# Altium footprint library terminal_blocks.PcbLib: 74 footprints (part 3 of 5)
Each footprint in its own frame and in the unit in brackets; x right, y up, seen from the top. Pads: shape width x height; smd on the part's side, far side on the other; paste and mask are expansions set on the pad; w line width, h text height; cw(c..) or ccw(c..) is an arc to the next point about the centre after c.
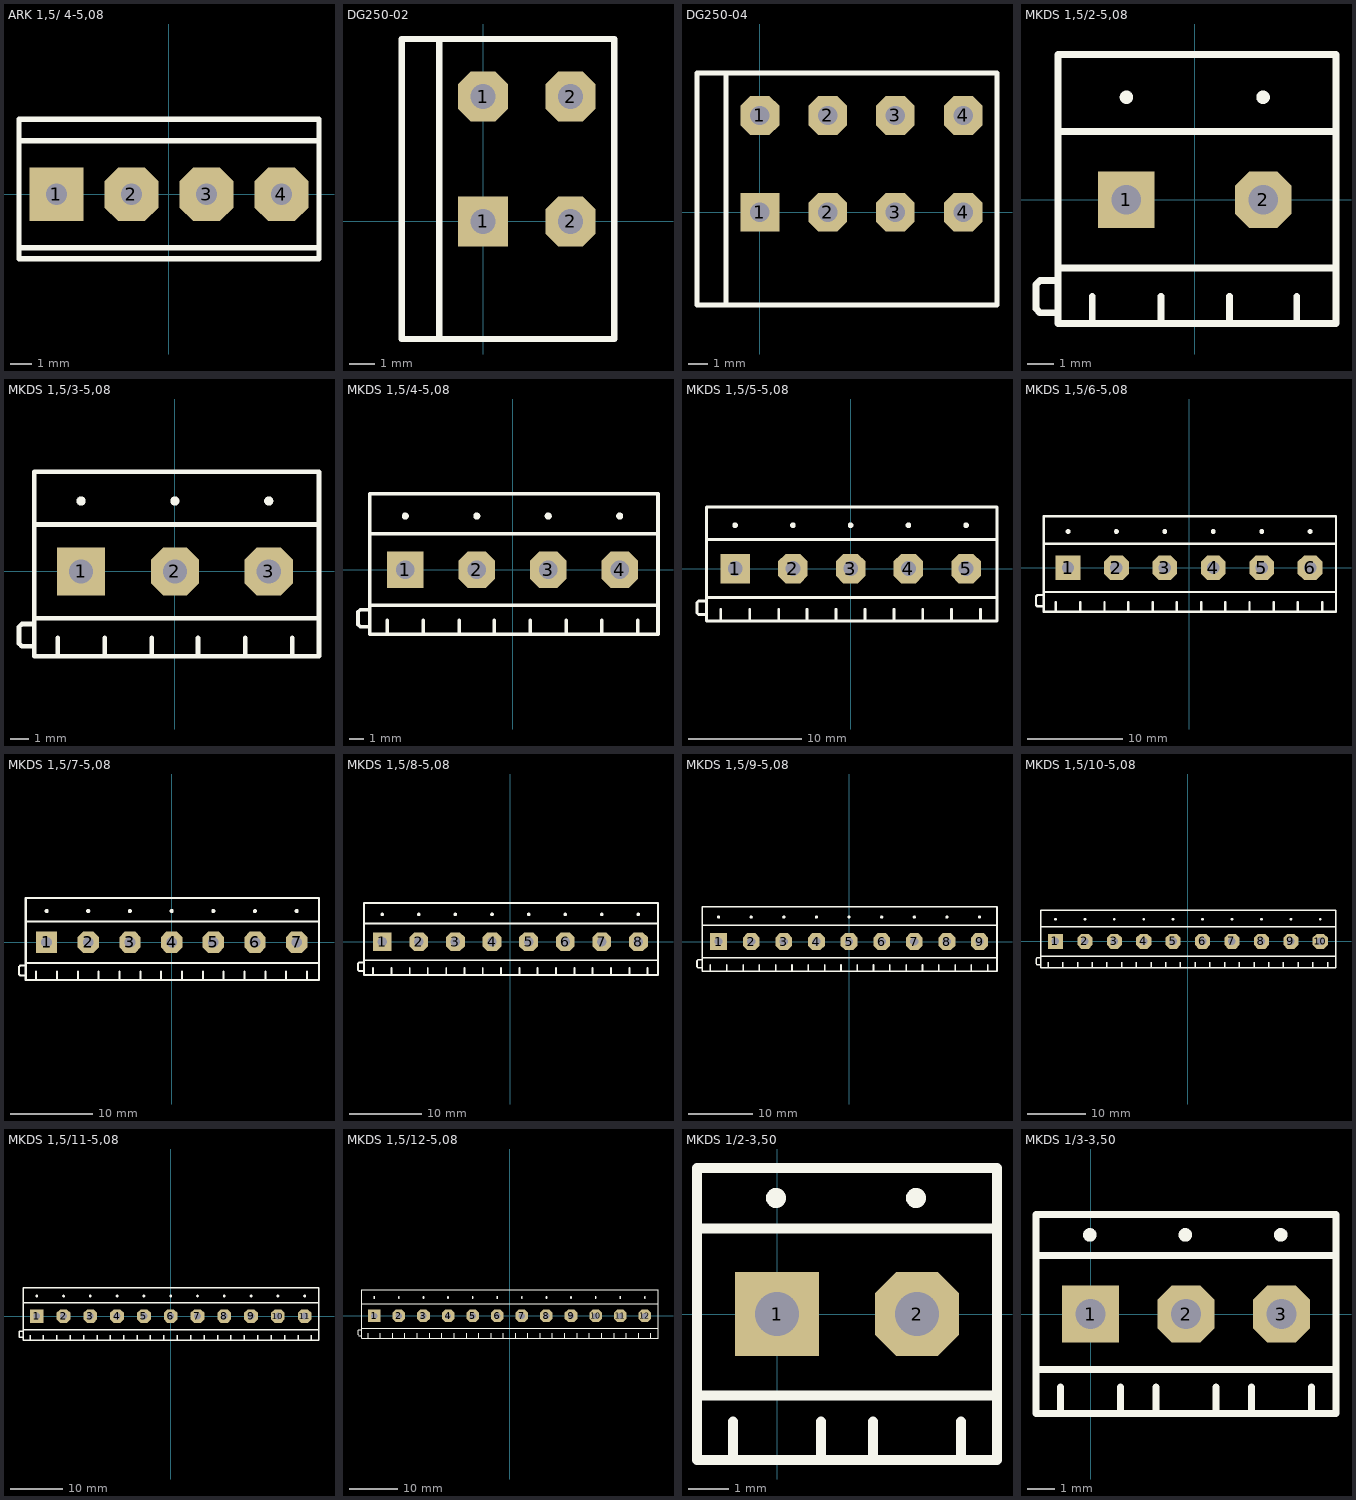
[diagram p2: the footprints below, top view; thin cyan lines are the x and y axes]

## ARK 1,5/ 4-5,08 [mm]
pads (4):
  rect 2.5x2.5 hole 1: 1(-5.25,0)
  oct 2.5x2.5 hole 1: 2(-1.75,0) 3(1.75,0) 4(5.25,0)
Top Overlay:
  lines w0.254: -7,-2.5 7,-2.5 ; -7,2.5 7,2.5 ; -7,-3 7,-3 7,3.5 -7,3.5 -7,-3

## DG250-02 [mm]
pads (4):
  rect 2x2 hole 1: 1(0,0)
  oct 2x2 hole 1: 1(0,5) 2(3.5,0) 2(3.5,5)
Top Overlay:
  lines w0.254: -1.75,-4.7 -3.25,-4.7 -3.25,7.3 -1.75,7.3 ; -1.75,-4.7 -1.75,7.3 ; -1.75,-4.7 5.25,-4.7 5.25,7.3 -1.75,7.3
3D body "User Library-wago250-101.STEP": height 12.67, standoff 0, extent -3.25,-4.7 1.75,7.3
3D body "User Library-wago250-101_no_tap.step": height 12.68, standoff 0, extent 1.75,-4.7 5.25,7.3

## DG250-04 [mm]
pads (8):
  rect 2x2 hole 1: 1(0,0)
  oct 2x2 hole 1: 1(0,5) 2(3.5,0) 2(3.5,5) 3(7,0) 3(7,5) 4(10.5,0) 4(10.5,5)
Top Overlay:
  lines w0.254: -1.75,-4.8 12.25,-4.8 12.25,7.2 -1.75,7.2 ; -1.75,-4.8 -1.75,7.2 ; -1.75,-4.8 -3.25,-4.8 -3.25,7.2 -1.75,7.2
3D body "User Library-wago250-101_no_tap.step": height 12.68, standoff 0, extent 8.75,-4.8 12.25,7.2
3D body "User Library-wago250-101.step": height 12.67, standoff 0, extent -3.25,-4.8 1.75,7.2
3D body "User Library-wago250-101_no_tap.step": height 12.68, standoff 0, extent 1.75,-4.8 5.25,7.2
3D body "User Library-wago250-101_no_tap.step": height 12.68, standoff 0, extent 5.25,-4.8 8.75,7.2

## MKDS 1,5/2-5,08 [mm] "Phoenix Contact MKDS 1,5,  5,08mm PITCH PCB Terminal Block"
height 13.8
pads (2):
  rect 2.1x2.1 hole 1.1: 1(-2.54,0)
  oct 2.1x2.1 hole 1.1: 2(2.54,0)
Top Overlay:
  circle w0.25: c2.54,3.81 r0.125
  circle w0.25: c-2.54,3.81 r0.125
  lines w0.254: -5.1,-3 -5.75,-3 -5.9,-3.15 -5.9,-4.05 -5.75,-4.2 -5.08,-4.2 ; -5.08,-2.54 5.08,-2.54 ; -5.08,2.54 5.08,2.54 ; -3.81,-4.6 -3.81,-3.584 ; -1.26,-4.6 -1.26,-3.584 ; 1.29,-4.6 1.29,-3.584 ; 3.79,-4.6 3.79,-3.584 ; -5.08,-4.6 5.25,-4.6 5.25,5.4 -5.08,5.4 -5.08,-4.6
3D body "1715721.stp": height 14.2, standoff -3.5, extent -5.842,-4.473 5.059,5.327

## MKDS 1,5/3-5,08 [mm] "Phoenix Contact MKDS 1,5,  5,08mm PITCH PCB Terminal Block"
height 13
pads (3):
  rect 2.6x2.6 hole 1.3: 1(-5.08,0)
  oct 2.6x2.6 hole 1.3: 2(0,0) 3(5.08,0)
Top Overlay:
  circle w0.25: c5.08,3.81 r0.125
  circle w0.25: c0,3.81 r0.125
  circle w0.25: c-5.08,3.81 r0.125
  lines w0.254: -7.64,-2.85 -8.29,-2.85 -8.44,-3 -8.44,-3.9 -8.29,-4.05 -7.62,-4.05 ; -7.62,-2.54 7.62,-2.54 ; -6.35,-4.6 -6.35,-3.584 ; -3.8,-4.6 -3.8,-3.584 ; -1.25,-4.6 -1.25,-3.584 ; 1.25,-4.6 1.25,-3.584 ; 3.8,-4.6 3.8,-3.584 ; 6.35,-4.6 6.35,-3.584 ; 7.62,2.54 -7.62,2.54 ; -7.62,2.54 -7.62,5.4 7.8,5.4 7.8,-4.6 -7.62,-4.6 -7.62,2.54
3D body "1715734.stp": height 14.2, standoff -3.5, extent -8.291,-4.5 7.691,5.3

## MKDS 1,5/4-5,08 [mm] "Phoenix Contact MKDS 1,5,  5,08mm PITCH PCB Terminal Block"
height 13
pads (4):
  rect 2.6x2.6 hole 1.3: 1(-7.62,0)
  oct 2.6x2.6 hole 1.3: 2(-2.54,0) 3(2.54,0) 4(7.62,0)
Top Overlay:
  circle w0.25: c7.62,3.81 r0.125
  circle w0.25: c-2.54,3.81 r0.125
  circle w0.25: c-7.62,3.81 r0.125
  circle w0.25: c2.54,3.81 r0.125
  lines w0.254: -10.18,-2.85 -10.83,-2.85 -10.98,-3 -10.98,-3.9 -10.83,-4.05 -10.16,-4.05 ; -10.16,-2.54 10.287,-2.54 ; -8.89,-4.6 -8.89,-3.584 ; -6.34,-4.6 -6.34,-3.584 ; -3.79,-4.6 -3.79,-3.584 ; -1.29,-4.6 -1.29,-3.584 ; 1.26,-4.6 1.26,-3.584 ; 3.81,-4.6 3.81,-3.584 ; 6.34,-4.6 6.34,-3.584 ; 8.89,-4.6 8.89,-3.584 ; 10.287,-4.6 -10.16,-4.6 -10.16,2.54 ; 10.287,2.54 -10.16,2.54 ; 10.287,5.4 -10.16,5.4 -10.16,2.54 ; 10.34,-4.6 10.34,5.4
3D body "1715747.stp": height 14.2, standoff -3.5, extent -10.774,-4.519 10.287,5.281

## MKDS 1,5/5-5,08 [mm] "Phoenix Contact MKDS 1,5,  5,08mm PITCH PCB Terminal Block"
height 13
pads (5):
  rect 2.6x2.6 hole 1.3: 1(-10.16,0)
  oct 2.6x2.6 hole 1.3: 2(-5.08,0) 3(0,0) 4(5.08,0) 5(10.16,0)
Top Overlay:
  circle w0.25: c10.16,3.81 r0.125
  circle w0.25: c5.08,3.81 r0.125
  circle w0.25: c-5.08,3.81 r0.125
  circle w0.25: c-10.16,3.81 r0.125
  circle w0.25: c0,3.81 r0.125
  lines w0.254: -12.72,-2.85 -13.37,-2.85 -13.52,-3 -13.52,-3.9 -13.37,-4.05 -12.7,-4.05 ; -12.7,-2.54 12.88,-2.54 ; -11.43,-4.6 -11.43,-3.584 ; -8.88,-4.6 -8.88,-3.584 ; -6.33,-4.6 -6.33,-3.584 ; -3.83,-4.6 -3.83,-3.584 ; -1.28,-4.6 -1.28,-3.584 ; 1.27,-4.6 1.27,-3.584 ; 3.8,-4.6 3.8,-3.584 ; 6.35,-4.6 6.35,-3.584 ; 8.88,-4.6 8.88,-3.584 ; 11.43,-4.6 11.43,-3.584 ; 12.88,2.54 -12.7,2.54 ; -12.7,2.54 -12.7,5.4 12.88,5.4 12.88,-4.6 -12.7,-4.6 -12.7,2.54
3D body "1715734.stp": height 14.2, standoff -3.5, extent -3.211,-4.5 12.771,5.3
3D body "1715721.stp": height 14.2, standoff -3.5, extent -13.314,-4.5 -2.413,5.3

## MKDS 1,5/6-5,08 [mm] "Phoenix Contact MKDS 1,5,  5,08mm PITCH PCB Terminal Block"
height 13
pads (6):
  rect 2.6x2.6 hole 1.3: 1(-12.7,0)
  oct 2.6x2.6 hole 1.3: 2(-7.62,0) 3(-2.54,0) 4(2.54,0) 5(7.62,0) 6(12.7,0)
Top Overlay:
  circle w0.25: c7.62,3.81 r0.125
  circle w0.25: c12.7,3.81 r0.125
  circle w0.25: c2.54,3.81 r0.125
  circle w0.25: c-7.62,3.81 r0.125
  circle w0.25: c-12.7,3.81 r0.125
  circle w0.25: c-2.54,3.81 r0.125
  lines w0.254: -15.26,-2.85 -15.91,-2.85 -16.06,-3 -16.06,-3.9 -15.91,-4.05 -15.24,-4.05 ; -15.24,-2.54 15.367,-2.54 ; -13.97,-4.6 -13.97,-3.584 ; -11.42,-4.6 -11.42,-3.584 ; -8.87,-4.6 -8.87,-3.584 ; -6.37,-4.6 -6.37,-3.584 ; -3.82,-4.6 -3.82,-3.584 ; -1.27,-4.6 -1.27,-3.584 ; 1.26,-4.6 1.26,-3.584 ; 3.81,-4.6 3.81,-3.584 ; 6.34,-4.6 6.34,-3.584 ; 8.89,-4.6 8.89,-3.584 ; 11.42,-4.6 11.42,-3.584 ; 13.97,-4.6 13.97,-3.584 ; 15.367,-4.6 -15.24,-4.6 -15.24,2.54 ; 15.367,2.54 -15.24,2.54 ; 15.367,5.4 -15.24,5.4 -15.24,2.54 ; 15.42,-4.6 15.42,5.4
3D body "1715747.stp": height 14.2, standoff -3.5, extent -15.854,-4.519 5.207,5.281
3D body "1715721.stp": height 14.2, standoff -3.5, extent 4.455,-4.466 15.357,5.334

## MKDS 1,5/7-5,08 [mm] "Phoenix Contact MKDS 1,5,  5,08mm PITCH PCB Terminal Block"
height 13
pads (7):
  rect 2.6x2.6 hole 1.3: 1(-15.24,0)
  oct 2.6x2.6 hole 1.3: 2(-10.16,0) 3(-5.08,0) 4(0,0) 5(5.08,0) 6(10.16,0) 7(15.24,0)
Top Overlay:
  circle w0.25: c-5.08,3.81 r0.125
  circle w0.25: c-15.24,3.81 r0.125
  circle w0.25: c-10.16,3.81 r0.125
  circle w0.25: c0,3.81 r0.125
  circle w0.25: c15.24,3.81 r0.125
  circle w0.25: c5.08,3.81 r0.125
  circle w0.25: c10.16,3.81 r0.125
  lines w0.254: -17.8,-2.85 -18.45,-2.85 -18.6,-3 -18.6,-3.9 -18.45,-4.05 -17.78,-4.05 ; -17.78,-2.54 17.96,-2.54 ; -16.51,-4.6 -16.51,-3.584 ; -13.96,-4.6 -13.96,-3.584 ; -11.41,-4.6 -11.41,-3.584 ; -8.91,-4.6 -8.91,-3.584 ; -6.36,-4.6 -6.36,-3.584 ; -3.81,-4.6 -3.81,-3.584 ; -1.28,-4.6 -1.28,-3.584 ; 1.27,-4.6 1.27,-3.584 ; 3.83,-4.6 3.83,-3.584 ; 6.33,-4.6 6.33,-3.584 ; 8.88,-4.6 8.88,-3.584 ; 11.43,-4.6 11.43,-3.584 ; 13.96,-4.6 13.96,-3.584 ; 16.51,-4.6 16.51,-3.584 ; 17.907,2.54 -17.78,2.54 ; -17.78,2.54 -17.78,-4.6 17.96,-4.6 17.96,5.4 -17.78,5.4 -17.78,2.54
3D body "1715734.stp": height 14.2, standoff -3.5, extent 1.869,-4.5 17.851,5.3
3D body "1715747.stp": height 14.2, standoff -3.5, extent -18.394,-4.519 2.667,5.281

## MKDS 1,5/8-5,08 [mm] "Phoenix Contact MKDS 1,5,  5,08mm PITCH PCB Terminal Block"
height 13
pads (8):
  rect 2.6x2.6 hole 1.3: 1(-17.78,0)
  oct 2.6x2.6 hole 1.3: 2(-12.7,0) 3(-7.62,0) 4(-2.54,0) 5(2.54,0) 6(7.62,0) 7(12.7,0) 8(17.78,0)
Top Overlay:
  circle w0.25: c17.78,3.81 r0.125
  circle w0.25: c7.62,3.81 r0.125
  circle w0.25: c2.54,3.81 r0.125
  circle w0.25: c12.7,3.81 r0.125
  circle w0.25: c-2.54,3.81 r0.125
  circle w0.25: c-12.7,3.81 r0.125
  circle w0.25: c-17.78,3.81 r0.125
  circle w0.25: c-7.62,3.81 r0.125
  lines w0.254: -20.34,-2.85 -20.99,-2.85 -21.14,-3 -21.14,-3.9 -20.99,-4.05 -20.32,-4.05 ; -20.32,-2.54 20.5,-2.54 ; -19.05,-4.6 -19.05,-3.584 ; -16.5,-4.6 -16.5,-3.584 ; -13.95,-4.6 -13.95,-3.584 ; -11.45,-4.6 -11.45,-3.584 ; -8.9,-4.6 -8.9,-3.584 ; -6.35,-4.6 -6.35,-3.584 ; -3.82,-4.6 -3.82,-3.584 ; -1.27,-4.6 -1.27,-3.584 ; 1.29,-4.6 1.29,-3.584 ; 3.79,-4.6 3.79,-3.584 ; 6.34,-4.6 6.34,-3.584 ; 8.89,-4.6 8.89,-3.584 ; 11.42,-4.6 11.42,-3.584 ; 13.97,-4.6 13.97,-3.584 ; 16.53,-4.6 16.53,-3.584 ; 19.03,-4.6 19.03,-3.584 ; 20.5,2.54 -20.32,2.54 ; -20.32,2.54 -20.32,5.4 20.5,5.4 20.5,-4.6 -20.32,-4.6 -20.32,2.54
3D body "1715789.stp": height 14.2, standoff -3.5, extent -20.934,-4.519 20.447,5.281

## MKDS 1,5/9-5,08 [mm] "Phoenix Contact MKDS 1,5,  5,08mm PITCH PCB Terminal Block"
height 13
pads (9):
  rect 2.6x2.6 hole 1.3: 1(-20.32,0)
  oct 2.6x2.6 hole 1.3: 2(-15.24,0) 3(-10.16,0) 4(-5.08,0) 5(0,0) 6(5.08,0) 7(10.16,0) 8(15.24,0) 9(20.32,0)
Top Overlay:
  circle w0.25: c20.32,3.81 r0.125
  circle w0.25: c15.24,3.81 r0.125
  circle w0.25: c5.08,3.81 r0.125
  circle w0.25: c0,3.81 r0.125
  circle w0.25: c10.16,3.81 r0.125
  circle w0.25: c-5.08,3.81 r0.125
  circle w0.25: c-15.24,3.81 r0.125
  circle w0.25: c-20.32,3.81 r0.125
  circle w0.25: c-10.16,3.81 r0.125
  lines w0.254: -22.88,-2.85 -23.53,-2.85 -23.68,-3 -23.68,-3.9 -23.53,-4.05 -22.86,-4.05 ; -22.86,-2.54 22.987,-2.54 ; -21.59,-4.6 -21.59,-3.584 ; -19.04,-4.6 -19.04,-3.584 ; -16.49,-4.6 -16.49,-3.584 ; -13.99,-4.6 -13.99,-3.584 ; -11.44,-4.6 -11.44,-3.584 ; -8.89,-4.6 -8.89,-3.584 ; -6.36,-4.6 -6.36,-3.584 ; -3.81,-4.6 -3.81,-3.584 ; -1.25,-4.6 -1.25,-3.584 ; 1.25,-4.6 1.25,-3.584 ; 3.8,-4.6 3.8,-3.584 ; 6.35,-4.6 6.35,-3.584 ; 8.88,-4.6 8.88,-3.584 ; 11.43,-4.6 11.43,-3.584 ; 13.96,-4.6 13.96,-3.584 ; 16.51,-4.6 16.51,-3.584 ; 19.04,-4.6 19.04,-3.584 ; 21.59,-4.6 21.59,-3.584 ; 22.987,2.54 -22.86,2.54 ; -22.86,2.54 -22.86,5.4 23.04,5.4 23.04,-4.6 -22.86,-4.6 -22.86,2.54
3D body "1715747.stp": height 14.2, standoff -3.5, extent -23.474,-4.519 -2.413,5.281
3D body "1715734.stp": height 14.2, standoff -3.5, extent -3.154,-4.519 12.827,5.281
3D body "1715721.stp": height 14.2, standoff -3.5, extent 12.065,-4.519 22.966,5.281

## MKDS 1,5/10-5,08 [mm] "Phoenix Contact MKDS 1,5,  5,08mm PITCH PCB Terminal Block"
height 13
pads (10):
  rect 2.6x2.6 hole 1.3: 1(-22.86,0)
  oct 2.6x2.6 hole 1.3: 2(-17.78,0) 3(-12.7,0) 4(-7.62,0) 5(-2.54,0) 6(2.54,0) 7(7.62,0) 8(12.7,0) 9(17.78,0) 10(22.86,0)
Top Overlay:
  circle w0.25: c-7.62,3.81 r0.125
  circle w0.25: c-17.78,3.81 r0.125
  circle w0.25: c-22.86,3.81 r0.125
  circle w0.25: c-12.7,3.81 r0.125
  circle w0.25: c7.62,3.81 r0.125
  circle w0.25: c-2.54,3.81 r0.125
  circle w0.25: c2.54,3.81 r0.125
  circle w0.25: c22.86,3.81 r0.125
  circle w0.25: c12.7,3.81 r0.125
  circle w0.25: c17.78,3.81 r0.125
  lines w0.254: -25.42,-2.85 -26.07,-2.85 -26.22,-3 -26.22,-3.9 -26.07,-4.05 -25.4,-4.05 ; -25.4,-2.54 25.58,-2.54 ; -24.13,-4.6 -24.13,-3.584 ; -21.58,-4.6 -21.58,-3.584 ; -19.03,-4.6 -19.03,-3.584 ; -16.53,-4.6 -16.53,-3.584 ; -13.98,-4.6 -13.98,-3.584 ; -11.43,-4.6 -11.43,-3.584 ; -8.9,-4.6 -8.9,-3.584 ; -6.35,-4.6 -6.35,-3.584 ; -3.79,-4.6 -3.79,-3.584 ; -1.29,-4.6 -1.29,-3.584 ; 1.26,-4.6 1.26,-3.584 ; 3.81,-4.6 3.81,-3.584 ; 6.34,-4.6 6.34,-3.584 ; 8.89,-4.6 8.89,-3.584 ; 11.45,-4.6 11.45,-3.584 ; 13.95,-4.6 13.95,-3.584 ; 16.5,-4.6 16.5,-3.584 ; 19.05,-4.6 19.05,-3.584 ; 21.58,-4.6 21.58,-3.584 ; 24.13,-4.6 24.13,-3.584 ; 25.527,5.4 -25.4,5.4 -25.4,2.54 ; 25.58,2.54 -25.4,2.54 ; 25.58,5.4 25.58,-4.6 -25.4,-4.6 -25.4,2.54
3D body "1715802.stp": height 14.2, standoff -3.5, extent -26.014,-4.519 25.527,5.281

## MKDS 1,5/11-5,08 [mm] "Phoenix Contact MKDS 1,5,  5,08mm PITCH PCB Terminal Block"
height 13
pads (11):
  rect 2.6x2.6 hole 1.3: 1(-25.4,0)
  oct 2.6x2.6 hole 1.3: 2(-20.32,0) 3(-15.24,0) 4(-10.16,0) 5(-5.08,0) 6(0,0) 7(5.08,0) 8(10.16,0) 9(15.24,0) 10(20.32,0) 11(25.4,0)
Top Overlay:
  circle w0.25: c20.32,3.81 r0.125
  circle w0.25: c15.24,3.81 r0.125
  circle w0.25: c25.4,3.81 r0.125
  circle w0.25: c10.16,3.81 r0.125
  circle w0.25: c0,3.81 r0.125
  circle w0.25: c-5.08,3.81 r0.125
  circle w0.25: c5.08,3.81 r0.125
  circle w0.25: c-10.16,3.81 r0.125
  circle w0.25: c-20.32,3.81 r0.125
  circle w0.25: c-25.4,3.81 r0.125
  circle w0.25: c-15.24,3.81 r0.125
  lines w0.254: -27.96,-2.85 -28.61,-2.85 -28.76,-3 -28.76,-3.9 -28.61,-4.05 -27.94,-4.05 ; -27.94,-2.54 28.067,-2.54 ; -26.67,-4.6 -26.67,-3.584 ; -24.12,-4.6 -24.12,-3.584 ; -21.57,-4.6 -21.57,-3.584 ; -19.07,-4.6 -19.07,-3.584 ; -16.52,-4.6 -16.52,-3.584 ; -13.97,-4.6 -13.97,-3.584 ; -11.44,-4.6 -11.44,-3.584 ; -8.89,-4.6 -8.89,-3.584 ; -6.33,-4.6 -6.33,-3.584 ; -3.83,-4.6 -3.83,-3.584 ; -1.28,-4.6 -1.28,-3.584 ; 1.27,-4.6 1.27,-3.584 ; 3.8,-4.6 3.8,-3.584 ; 6.35,-4.6 6.35,-3.584 ; 8.91,-4.6 8.91,-3.584 ; 11.41,-4.6 11.41,-3.584 ; 13.96,-4.6 13.96,-3.584 ; 16.51,-4.6 16.51,-3.584 ; 19.04,-4.6 19.04,-3.584 ; 21.59,-4.6 21.59,-3.584 ; 24.15,-4.6 24.15,-3.584 ; 26.65,-4.6 26.65,-3.584 ; 28.067,2.54 -27.94,2.54 ; 28.067,5.4 -27.94,5.4 -27.94,2.54 ; 28.12,5.4 28.12,-4.519 28.039,-4.6 -27.94,-4.6 -27.94,2.54
3D body "1715734.stp": height 14.2, standoff -3.5, extent 12.029,-4.5 28.011,5.3
3D body "1715789.stp": height 14.2, standoff -3.5, extent -28.554,-4.519 12.827,5.281

## MKDS 1,5/12-5,08 [mm] "Phoenix Contact MKDS 1,5,  5,08mm PITCH PCB Terminal Block"
height 13
pads (12):
  rect 2.6x2.6 hole 1.3: 1(-27.94,0)
  oct 2.6x2.6 hole 1.3: 2(-22.86,0) 3(-17.78,0) 4(-12.7,0) 5(-7.62,0) 6(-2.54,0) 7(2.54,0) 8(7.62,0) 9(12.7,0) 10(17.78,0) 11(22.86,0) 12(27.94,0)
Top Overlay:
  circle w0.25: c12.7,3.81 r0.125
  circle w0.25: c7.62,3.81 r0.125
  circle w0.25: c17.78,3.81 r0.125
  circle w0.25: c-2.54,3.81 r0.125
  circle w0.25: c-7.62,3.81 r0.125
  circle w0.25: c2.54,3.81 r0.125
  circle w0.25: c-17.78,3.81 r0.125
  circle w0.25: c-27.94,3.81 r0.125
  circle w0.25: c-22.86,3.81 r0.125
  circle w0.25: c-12.7,3.81 r0.125
  circle w0.25: c27.94,3.81 r0.125
  circle w0.25: c22.86,3.81 r0.125
  lines w0.254: -30.5,-2.85 -31.15,-2.85 -31.3,-3 -31.3,-3.9 -31.15,-4.05 -30.48,-4.05 ; -30.48,-2.54 30.66,-2.54 ; -29.21,-4.6 -29.21,-3.584 ; -26.66,-4.6 -26.66,-3.584 ; -24.11,-4.6 -24.11,-3.584 ; -21.61,-4.6 -21.61,-3.584 ; -19.06,-4.6 -19.06,-3.584 ; -16.51,-4.6 -16.51,-3.584 ; -13.98,-4.6 -13.98,-3.584 ; -11.43,-4.6 -11.43,-3.584 ; -8.87,-4.6 -8.87,-3.584 ; -6.37,-4.6 -6.37,-3.584 ; -3.82,-4.6 -3.82,-3.584 ; -1.27,-4.6 -1.27,-3.584 ; 1.26,-4.6 1.26,-3.584 ; 3.81,-4.6 3.81,-3.584 ; 6.37,-4.6 6.37,-3.584 ; 8.87,-4.6 8.87,-3.584 ; 11.42,-4.6 11.42,-3.584 ; 13.97,-4.6 13.97,-3.584 ; 16.5,-4.6 16.5,-3.584 ; 19.05,-4.6 19.05,-3.584 ; 21.58,-4.6 21.58,-3.584 ; 24.13,-4.6 24.13,-3.584 ; 26.66,-4.6 26.66,-3.584 ; 29.21,-4.6 29.21,-3.584 ; 30.66,2.54 -30.48,2.54 ; -30.48,2.54 -30.48,-4.6 30.66,-4.6 30.66,5.4 -30.48,5.4 -30.48,2.54
3D body "1715828.stp": height 14.2, standoff -3.5, extent -31.094,-4.519 30.607,5.281

## MKDS 1/2-3,50 [mm] "Phoenix Contact MKDS 1, 3,50mm PITCH PCB Terminal Block"
height 8.5
pads (2):
  rect 2.1x2.1 hole 1.1: 1(0,0)
  oct 2.1x2.1 hole 1.1: 2(3.5,0)
Top Overlay:
  circle w0.25: c-0.025,2.9 r0.125
  circle w0.25: c3.475,2.9 r0.125
  lines w0.254: -2,-2.04 5.5,-2.04 ; -2,2.14 5.5,2.14 ; -1.1,-3.65 -1.1,-2.684 ; 1.1,-3.65 1.1,-2.684 ; 2.4,-3.65 2.4,-2.684 ; 4.6,-3.65 4.6,-2.684 ; -2,-3.65 -2,3.65 5.5,3.65 5.5,-3.65 -2,-3.65
3D body "1751248.stp": height 8.5, standoff -3.5, extent -2,-3.65 5.5,3.65

## MKDS 1/3-3,50 [mm] "Phoenix Contact MKDS 1, 3,50mm PITCH PCB Terminal Block"
height 8.5
pads (3):
  rect 2.1x2.1 hole 1.1: 1(0,0)
  oct 2.1x2.1 hole 1.1: 2(3.5,0) 3(7,0)
Top Overlay:
  circle w0.25: c-0.025,2.9 r0.125
  circle w0.25: c3.475,2.9 r0.125
  circle w0.25: c6.975,2.9 r0.125
  lines w0.254: -2,-2.04 9,-2.04 ; -2,2.14 9,2.14 ; -1.1,-3.65 -1.1,-2.684 ; 1.1,-3.65 1.1,-2.684 ; 2.4,-3.65 2.4,-2.684 ; 4.6,-3.65 4.6,-2.684 ; 5.9,-3.65 5.9,-2.684 ; 8.1,-3.65 8.1,-2.684 ; -2,-3.65 -2,3.65 9,3.65 9,-3.65 -2,-3.65
3D body "1751251.stp": height 8.5, standoff -3.5, extent -2,-3.65 9,3.65